# Altium footprint library 集大电协1.5.PcbLib: 227 footprints (part 9 of 18)
Each footprint in its own frame and in the unit in brackets; x right, y up, seen from the top. Pads: shape width x height; smd on the part's side, far side on the other; paste and mask are expansions set on the pad; w line width, h text height; cw(c..) or ccw(c..) is an arc to the next point about the centre after c.
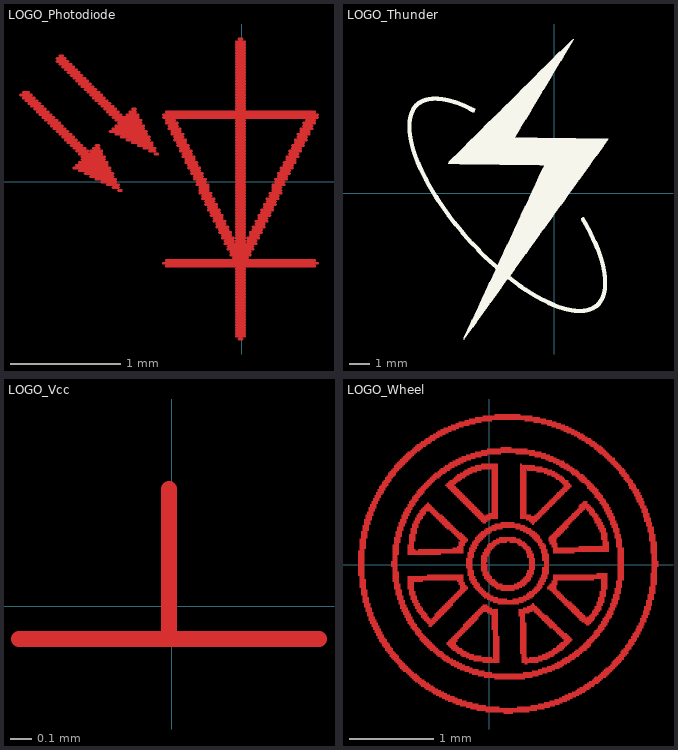
[diagram p8: the footprints below, top view; thin cyan lines are the x and y axes]

## LOGO_Photodiode [mm]
Top Layer:
  lines w0.025: -2.007,0.787 -1.905,0.787 ; -1.981,0.762 -1.88,0.762 ; -1.981,0.813 -1.93,0.813 ; -1.956,0.737 -1.854,0.737 ; -1.93,0.711 -1.829,0.711 ; -1.905,0.686 -1.803,0.686 ; -1.88,0.66 -1.778,0.66 ; -1.854,0.635 -1.753,0.635 ; -1.829,0.61 -1.727,0.61 ; -1.803,0.584 -1.702,0.584 ; -1.778,0.559 -1.676,0.559 ; -1.753,0.533 -1.651,0.533 ; -1.727,0.508 -1.626,0.508 ; -1.702,0.483 -1.6,0.483 ; -1.676,0.457 -1.575,0.457 ; -1.676,1.092 -1.575,1.092 ; -1.676,1.118 -1.6,1.118 ; -1.651,0.432 -1.549,0.432 ; -1.651,1.067 -1.549,1.067 ; -1.651,1.143 -1.626,1.143 ; -1.626,0.406 -1.524,0.406 ; -1.626,1.041 -1.524,1.041 ; -1.6,0.381 -1.499,0.381 ; -1.6,1.016 -1.499,1.016 ; -1.575,0.356 -1.473,0.356 ; -1.575,0.991 -1.473,0.991 ; -1.549,0.33 -1.448,0.33 ; -1.549,0.965 -1.448,0.965 ; -1.524,0.127 -1.194,0.127 ; -1.524,0.305 -1.422,0.305 ; -1.524,0.94 -1.422,0.94 ; -1.499,0.152 -1.219,0.152 ; -1.499,0.279 -1.397,0.279 ; -1.499,0.914 -1.397,0.914 ; -1.473,0.102 -1.194,0.102 ; -1.473,0.178 -1.219,0.178 ; -1.473,0.254 -1.27,0.254 ; -1.473,0.889 -1.372,0.889 ; -1.448,0.203 -1.245,0.203 ; -1.448,0.229 -1.245,0.229 ; -1.448,0.864 -1.346,0.864 ; -1.422,0.076 -1.168,0.076 ; -1.422,0.838 -1.321,0.838 ; -1.397,0.813 -1.295,0.813 ; -1.372,0.051 -1.168,0.051 ; -1.372,0.279 -1.27,0.279 ; -1.372,0.787 -1.27,0.787 ; -1.346,0.305 -1.295,0.305 ; -1.346,0.762 -1.245,0.762 ; -1.321,0.025 -1.143,0.025 ; -1.321,0.33 -1.295,0.33 ; -1.321,0.737 -1.219,0.737 ; -1.295,0.711 -1.194,0.711 ; -1.27,0 -1.143,0 ; -1.27,0.686 -1.168,0.686 ; -1.245,0.66 -1.143,0.66 ; -1.219,-0.025 -1.118,-0.025 ; -1.219,0.635 -1.118,0.635 ; -1.194,0.457 -0.864,0.457 ; -1.194,0.61 -1.092,0.61 ; -1.168,-0.051 -1.118,-0.051 ; -1.168,0.483 -0.889,0.483 ; -1.168,0.584 -0.94,0.584 ; -1.143,0.432 -0.864,0.432 ; -1.143,0.508 -0.889,0.508 ; -1.143,0.559 -0.914,0.559 ; -1.118,-0.076 -1.092,-0.076 ; -1.118,0.533 -0.914,0.533 ; -1.092,0.406 -0.838,0.406 ; -1.041,0.381 -0.838,0.381 ; -1.041,0.61 -0.94,0.61 ; -1.016,0.635 -0.965,0.635 ; -0.991,0.356 -0.813,0.356 ; -0.991,0.66 -0.965,0.66 ; -0.94,0.33 -0.813,0.33 ; -0.889,0.305 -0.787,0.305 ; -0.838,0.279 -0.787,0.279 ; -0.787,0.254 -0.762,0.254 ; -0.711,-0.737 0.686,-0.737 ; -0.711,0.584 0.686,0.584 ; -0.711,0.61 0.686,0.61 ; -0.686,-0.762 0.66,-0.762 ; -0.686,-0.711 0.66,-0.711 ; -0.686,0.533 -0.584,0.533 ; -0.686,0.559 -0.61,0.559 ; -0.686,0.635 0.66,0.635 ; -0.66,0.483 -0.559,0.483 ; -0.66,0.508 -0.584,0.508 ; -0.635,0.432 -0.533,0.432 ; -0.635,0.457 -0.559,0.457 ; -0.61,0.381 -0.508,0.381 ; -0.61,0.406 -0.533,0.406 ; -0.584,0.33 -0.483,0.33 ; -0.584,0.356 -0.508,0.356 ; -0.559,0.279 -0.457,0.279 ; -0.559,0.305 -0.483,0.305 ; -0.533,0.229 -0.432,0.229 ; -0.533,0.254 -0.457,0.254 ; -0.508,0.178 -0.406,0.178 ; -0.508,0.203 -0.432,0.203 ; -0.483,0.127 -0.381,0.127 ; -0.483,0.152 -0.406,0.152 ; -0.457,0.076 -0.356,0.076 ; -0.457,0.102 -0.381,0.102 ; -0.432,0.025 -0.33,0.025 ; -0.432,0.051 -0.356,0.051 ; -0.406,-0.025 -0.305,-0.025 ; -0.406,0 -0.33,0 ; -0.381,-0.102 -0.279,-0.102 ; -0.381,-0.076 -0.305,-0.076 ; -0.381,-0.051 -0.305,-0.051 ; -0.356,-0.152 -0.254,-0.152 ; -0.356,-0.127 -0.279,-0.127 ; -0.33,-0.203 -0.229,-0.203 ; -0.33,-0.178 -0.254,-0.178 ; -0.305,-0.254 -0.203,-0.254 ; -0.305,-0.229 -0.229,-0.229 ; -0.279,-0.305 -0.178,-0.305 ; -0.279,-0.279 -0.203,-0.279 ; -0.254,-0.356 -0.152,-0.356 ; -0.254,-0.33 -0.178,-0.33 ; -0.229,-0.406 -0.127,-0.406 ; -0.229,-0.381 -0.152,-0.381 ; -0.203,-0.457 -0.102,-0.457 ; -0.203,-0.432 -0.127,-0.432 ; -0.178,-0.508 -0.076,-0.508 ; -0.178,-0.483 -0.102,-0.483 ; -0.152,-0.559 0.127,-0.559 ; -0.152,-0.533 -0.076,-0.533 ; -0.127,-0.61 0.102,-0.61 ; -0.127,-0.584 0.102,-0.584 ; -0.102,-0.66 0.076,-0.66 ; -0.102,-0.635 0.076,-0.635 ; -0.076,-0.686 0.051,-0.686 ; -0.051,-1.397 0.025,-1.397 ; -0.051,-1.372 0.025,-1.372 ; -0.051,-1.346 0.025,-1.346 ; -0.051,-1.321 0.025,-1.321 ; -0.051,-1.295 0.025,-1.295 ; -0.051,-1.27 0.025,-1.27 ; -0.051,-1.245 0.025,-1.245 ; -0.051,-1.219 0.025,-1.219 ; -0.051,-1.194 0.025,-1.194 ; -0.051,-1.168 0.025,-1.168 ; -0.051,-1.143 0.025,-1.143 ; -0.051,-1.118 0.025,-1.118 ; -0.051,-1.092 0.025,-1.092 ; -0.051,-1.067 0.025,-1.067 ; -0.051,-1.041 0.025,-1.041 ; -0.051,-1.016 0.025,-1.016 ; -0.051,-0.991 0.025,-0.991 ; -0.051,-0.965 0.025,-0.965 ; -0.051,-0.94 0.025,-0.94 ; -0.051,-0.914 0.025,-0.914 ; -0.051,-0.889 0.025,-0.889 ; -0.051,-0.864 0.025,-0.864 ; -0.051,-0.838 0.025,-0.838 ; -0.051,-0.813 0.025,-0.813 ; -0.051,-0.787 0.025,-0.787 ; -0.051,-0.533 0.025,-0.533 ; -0.051,-0.508 0.025,-0.508 ; -0.051,-0.483 0.025,-0.483 ; -0.051,-0.457 0.025,-0.457 ; -0.051,-0.432 0.025,-0.432 ; -0.051,-0.406 0.025,-0.406 ; -0.051,-0.381 0.025,-0.381 ; -0.051,-0.356 0.025,-0.356 ; -0.051,-0.33 0.025,-0.33 ; -0.051,-0.305 0.025,-0.305 ; -0.051,-0.279 0.025,-0.279 ; -0.051,-0.254 0.025,-0.254 ; -0.051,-0.229 0.025,-0.229 ; -0.051,-0.203 0.025,-0.203 ; -0.051,-0.178 0.025,-0.178 ; -0.051,-0.152 0.025,-0.152 ; -0.051,-0.127 0.025,-0.127 ; -0.051,-0.102 0.025,-0.102 ; -0.051,-0.076 0.025,-0.076 ; -0.051,-0.051 0.025,-0.051 ; -0.051,-0.025 0.025,-0.025 ; -0.051,0 0.025,0 ; -0.051,0.025 0.025,0.025 ; -0.051,0.051 0.025,0.051 ; -0.051,0.076 0.025,0.076 ; -0.051,0.102 0.025,0.102 ; -0.051,0.127 0.025,0.127 ; -0.051,0.152 0.025,0.152 ; -0.051,0.178 0.025,0.178 ; -0.051,0.203 0.025,0.203 ; -0.051,0.229 0.025,0.229 ; -0.051,0.254 0.025,0.254 ; -0.051,0.279 0.025,0.279 ; -0.051,0.305 0.025,0.305 ; -0.051,0.33 0.025,0.33 ; -0.051,0.356 0.025,0.356 ; -0.051,0.381 0.025,0.381 ; -0.051,0.406 0.025,0.406 ; -0.051,0.432 0.025,0.432 ; -0.051,0.457 0.025,0.457 ; -0.051,0.483 0.025,0.483 ; -0.051,0.508 0.025,0.508 ; -0.051,0.533 0.025,0.533 ; -0.051,0.559 0.025,0.559 ; -0.051,0.66 0.025,0.66 ; -0.051,0.686 0.025,0.686 ; -0.051,0.711 0.025,0.711 ; -0.051,0.737 0.025,0.737 ; -0.051,0.762 0.025,0.762 ; -0.051,0.787 0.025,0.787 ; -0.051,0.813 0.025,0.813 ; -0.051,0.838 0.025,0.838 ; -0.051,0.864 0.025,0.864 ; -0.051,0.889 0.025,0.889 ; -0.051,0.914 0.025,0.914 ; -0.051,0.94 0.025,0.94 ; -0.051,0.965 0.025,0.965 ; -0.051,0.991 0.025,0.991 ; -0.051,1.016 0.025,1.016 ; -0.051,1.041 0.025,1.041 ; -0.051,1.067 0.025,1.067 ; -0.051,1.092 0.025,1.092 ; -0.051,1.118 0.025,1.118 ; -0.051,1.143 0.025,1.143 ; -0.051,1.168 0.025,1.168 ; -0.051,1.194 0.025,1.194 ; -0.051,1.219 0.025,1.219 ; -0.051,1.245 0.025,1.245 ; -0.051,1.27 0.025,1.27 ; -0.025,-1.422 0,-1.422 ; -0.025,1.295 0,1.295 ; 0.051,-0.533 0.127,-0.533 ; 0.051,-0.508 0.152,-0.508 ; 0.076,-0.483 0.152,-0.483 ; 0.076,-0.457 0.178,-0.457 ; 0.102,-0.432 0.178,-0.432 ; 0.102,-0.406 0.203,-0.406 ; 0.127,-0.381 0.203,-0.381 ; 0.127,-0.356 0.229,-0.356 ; 0.152,-0.33 0.229,-0.33 ; 0.152,-0.305 0.254,-0.305 ; 0.178,-0.279 0.254,-0.279 ; 0.178,-0.254 0.279,-0.254 ; 0.203,-0.229 0.279,-0.229 ; 0.203,-0.203 0.305,-0.203 ; 0.229,-0.178 0.305,-0.178 ; 0.229,-0.152 0.33,-0.152 ; 0.254,-0.127 0.33,-0.127 ; 0.254,-0.102 0.356,-0.102 ; 0.279,-0.076 0.356,-0.076 ; 0.279,-0.051 0.356,-0.051 ; 0.279,-0.025 0.381,-0.025 ; 0.305,0 0.381,0 ; 0.305,0.025 0.406,0.025 ; 0.33,0.051 0.406,0.051 ; 0.33,0.076 0.432,0.076 ; 0.356,0.102 0.432,0.102 ; 0.356,0.127 0.457,0.127 ; 0.381,0.152 0.457,0.152 ; 0.381,0.178 0.483,0.178 ; 0.406,0.203 0.483,0.203 ; 0.406,0.229 0.508,0.229 ; 0.432,0.254 0.508,0.254 ; 0.432,0.279 0.533,0.279 ; 0.457,0.305 0.533,0.305 ; 0.457,0.33 0.559,0.33 ; 0.483,0.356 0.559,0.356 ; 0.483,0.381 0.584,0.381 ; 0.508,0.406 0.584,0.406 ; 0.508,0.432 0.61,0.432 ; 0.533,0.457 0.61,0.457 ; 0.533,0.483 0.635,0.483 ; 0.559,0.508 0.635,0.508 ; 0.559,0.533 0.66,0.533 ; 0.584,0.559 0.66,0.559

## LOGO_Thunder [mm]
Top Overlay:
  drawing of 2284 lines, arcs and shapes, not listed

## LOGO_Vcc [mm]
Top Layer:
  lines w0.076: -0.711,-0.152 0.686,-0.152 ; -0.013,-0.152 -0.013,0.546
  text "5V" at -0.584,-0.914 h1.02

## LOGO_Wheel [mm]
Top Layer:
  lines w0.018: -1.554,-0.124 -1.483,-0.124 ; -1.554,-0.107 -1.483,-0.107 ; -1.554,-0.089 -1.483,-0.089 ; -1.554,-0.071 -1.483,-0.071 ; -1.554,-0.053 -1.483,-0.053 ; -1.554,-0.036 -1.483,-0.036 ; -1.554,-0.018 -1.483,-0.018 ; -1.554,0 -1.483,0 ; -1.554,0.018 -1.483,0.018 ; -1.554,0.036 -1.483,0.036 ; -1.554,0.053 -1.483,0.053 ; -1.554,0.071 -1.483,0.071 ; -1.554,0.089 -1.483,0.089 ; -1.554,0.107 -1.483,0.107 ; -1.554,0.124 -1.483,0.124 ; -1.554,0.142 -1.483,0.142 ; -1.554,0.16 -1.483,0.16 ; -1.537,-0.267 -1.466,-0.267 ; -1.537,-0.249 -1.466,-0.249 ; -1.537,-0.231 -1.466,-0.231 ; -1.537,-0.213 -1.466,-0.213 ; -1.537,-0.196 -1.466,-0.196 ; -1.537,-0.178 -1.466,-0.178 ; -1.537,-0.16 -1.483,-0.16 ; -1.537,-0.142 -1.483,-0.142 ; -1.537,0.178 -1.483,0.178 ; -1.537,0.196 -1.466,0.196 ; -1.537,0.213 -1.466,0.213 ; -1.537,0.231 -1.466,0.231 ; -1.537,0.249 -1.466,0.249 ; -1.537,0.267 -1.466,0.267 ; -1.537,0.284 -1.466,0.284 ; -1.537,0.302 -1.466,0.302 ; -1.519,-0.356 -1.448,-0.356 ; -1.519,-0.338 -1.448,-0.338 ; -1.519,-0.32 -1.448,-0.32 ; -1.519,-0.302 -1.448,-0.302 ; -1.519,-0.284 -1.466,-0.284 ; -1.519,0.32 -1.448,0.32 ; -1.519,0.338 -1.448,0.338 ; -1.519,0.356 -1.448,0.356 ; -1.519,0.373 -1.448,0.373 ; -1.519,0.391 -1.448,0.391 ; -1.501,-0.445 -1.43,-0.445 ; -1.501,-0.427 -1.43,-0.427 ; -1.501,-0.409 -1.43,-0.409 ; -1.501,-0.391 -1.43,-0.391 ; -1.501,-0.373 -1.448,-0.373 ; -1.501,0.409 -1.43,0.409 ; -1.501,0.427 -1.43,0.427 ; -1.501,0.445 -1.43,0.445 ; -1.501,0.462 -1.43,0.462 ; -1.483,-0.498 -1.412,-0.498 ; -1.483,-0.48 -1.412,-0.48 ; -1.483,-0.462 -1.412,-0.462 ; -1.483,0.48 -1.412,0.48 ; -1.483,0.498 -1.412,0.498 ; -1.483,0.516 -1.412,0.516 ; -1.483,0.533 -1.394,0.533 ; -1.466,-0.551 -1.394,-0.551 ; -1.466,-0.533 -1.394,-0.533 ; -1.466,-0.516 -1.394,-0.516 ; -1.466,0.551 -1.394,0.551 ; -1.466,0.569 -1.394,0.569 ; -1.466,0.587 -1.377,0.587 ; -1.448,-0.605 -1.377,-0.605 ; -1.448,-0.587 -1.377,-0.587 ; -1.448,-0.569 -1.377,-0.569 ; -1.448,0.605 -1.377,0.605 ; -1.448,0.622 -1.377,0.622 ; -1.43,-0.658 -1.341,-0.658 ; -1.43,-0.64 -1.359,-0.64 ; -1.43,-0.622 -1.359,-0.622 ; -1.43,0.64 -1.359,0.64 ; -1.43,0.658 -1.359,0.658 ; -1.43,0.676 -1.341,0.676 ; -1.412,-0.693 -1.323,-0.693 ; -1.412,-0.676 -1.341,-0.676 ; -1.412,0.693 -1.341,0.693 ; -1.412,0.711 -1.341,0.711 ; -1.394,-0.729 -1.306,-0.729 ; -1.394,-0.711 -1.323,-0.711 ; -1.394,0.729 -1.323,0.729 ; -1.394,0.747 -1.323,0.747 ; -1.377,-0.765 -1.288,-0.765 ; -1.377,-0.747 -1.306,-0.747 ; -1.377,0.765 -1.306,0.765 ; -1.377,0.782 -1.306,0.782 ; -1.359,-0.8 -1.27,-0.8 ; -1.359,-0.782 -1.288,-0.782 ; -1.359,0.8 -1.288,0.8 ; -1.359,0.818 -1.288,0.818 ; -1.341,-0.836 -1.252,-0.836 ; -1.341,-0.818 -1.27,-0.818 ; -1.341,0.836 -1.27,0.836 ; -1.341,0.853 -1.252,0.853 ; -1.323,-0.871 -1.234,-0.871 ; -1.323,-0.853 -1.252,-0.853 ; -1.323,0.871 -1.252,0.871 ; -1.323,0.889 -1.234,0.889 ; -1.306,-0.907 -1.217,-0.907 ; -1.306,-0.889 -1.217,-0.889 ; -1.306,0.907 -1.234,0.907 ; -1.306,0.925 -1.217,0.925 ; -1.288,-0.925 -1.199,-0.925 ; -1.288,0.942 -1.199,0.942 ; -1.27,-0.96 -1.181,-0.96 ; -1.27,-0.942 -1.181,-0.942 ; -1.27,0.96 -1.199,0.96 ; -1.27,0.978 -1.181,0.978 ; -1.252,-0.978 -1.163,-0.978 ; -1.252,0.996 -1.163,0.996 ; -1.234,-1.013 -1.146,-1.013 ; -1.234,-0.996 -1.146,-0.996 ; -1.234,1.013 -1.163,1.013 ; -1.234,1.031 -1.146,1.031 ; -1.217,-1.031 -1.128,-1.031 ; -1.217,1.049 -1.128,1.049 ; -1.199,-1.049 -1.11,-1.049 ; -1.199,1.067 -1.11,1.067 ; -1.199,1.085 -1.11,1.085 ; -1.181,-1.085 -1.074,-1.085 ; -1.181,-1.067 -1.092,-1.067 ; -1.181,1.102 -1.092,1.102 ; -1.163,-1.102 -1.074,-1.102 ; -1.163,-0.018 -1.092,-0.018 ; -1.163,0 -1.092,0 ; -1.163,0.018 -1.092,0.018 ; -1.163,0.036 -1.092,0.036 ; -1.163,1.12 -1.074,1.12 ; -1.146,-1.12 -1.057,-1.12 ; -1.146,-0.196 -1.074,-0.196 ; -1.146,-0.178 -1.074,-0.178 ; -1.146,-0.16 -1.074,-0.16 ; -1.146,-0.142 -1.074,-0.142 ; -1.146,-0.124 -1.074,-0.124 ; -1.146,-0.107 -1.074,-0.107 ; -1.146,-0.089 -1.074,-0.089 ; -1.146,-0.071 -1.092,-0.071 ; -1.146,-0.053 -1.092,-0.053 ; -1.146,-0.036 -1.092,-0.036 ; -1.146,0.053 -1.092,0.053 ; -1.146,0.071 -1.092,0.071 ; -1.146,0.089 -1.092,0.089 ; -1.146,0.107 -1.092,0.107 ; -1.146,0.124 -1.074,0.124 ; -1.146,0.142 -1.074,0.142 ; -1.146,0.16 -1.074,0.16 ; -1.146,0.178 -1.074,0.178 ; -1.146,0.196 -1.074,0.196 ; -1.146,0.213 -1.074,0.213 ; -1.146,0.231 -1.074,0.231 ; -1.146,1.138 -1.057,1.138 ; -1.128,-1.138 -1.039,-1.138 ; -1.128,-0.284 -1.057,-0.284 ; -1.128,-0.267 -1.057,-0.267 ; -1.128,-0.249 -1.057,-0.249 ; -1.128,-0.231 -1.057,-0.231 ; -1.128,-0.213 -1.074,-0.213 ; -1.128,0.249 -1.074,0.249 ; -1.128,0.267 -1.057,0.267 ; -1.128,0.284 -1.057,0.284 ; -1.128,0.302 -1.057,0.302 ; -1.128,0.32 -1.057,0.32 ; -1.128,1.156 -1.039,1.156 ; -1.128,1.173 -1.021,1.173 ; -1.11,-1.156 -1.021,-1.156 ; -1.11,-0.356 -1.039,-0.356 ; -1.11,-0.338 -1.039,-0.338 ; -1.11,-0.32 -1.039,-0.32 ; -1.11,-0.302 -1.039,-0.302 ; -1.11,0.338 -1.039,0.338 ; -1.11,0.356 -1.039,0.356 ; -1.11,0.373 -1.039,0.373 ; -1.11,0.391 -1.039,0.391 ; -1.11,1.191 -1.003,1.191 ; -1.092,-1.173 -1.003,-1.173 ; -1.092,-0.409 -1.021,-0.409 ; -1.092,-0.391 -1.021,-0.391 ; -1.092,-0.373 -1.021,-0.373 ; -1.092,0.409 -1.021,0.409 ; -1.092,0.427 -1.021,0.427 ; -1.092,0.445 -1.021,0.445 ; -1.092,1.209 -0.986,1.209 ; -1.074,-1.209 -0.968,-1.209 ; -1.074,-1.191 -0.986,-1.191 ; -1.074,-0.462 -1.003,-0.462 ; -1.074,-0.445 -1.003,-0.445 ; -1.074,-0.427 -1.003,-0.427 ; -1.074,0.462 -1.003,0.462 ; -1.074,0.48 -1.003,0.48 ; -1.074,0.498 -0.986,0.498 ; -1.074,1.227 -0.968,1.227 ; -1.057,-1.227 -0.95,-1.227 ; -1.057,-0.516 -0.968,-0.516 ; -1.057,-0.498 -0.986,-0.498 ; -1.057,-0.48 -0.986,-0.48 ; -1.057,0.516 -0.986,0.516 ; -1.057,0.533 -0.986,0.533 ; -1.057,1.245 -0.95,1.245 ; -1.039,-1.245 -0.932,-1.245 ; -1.039,-0.551 -0.95,-0.551 ; -1.039,-0.533 -0.968,-0.533 ; -1.039,0.551 -0.968,0.551 ; -1.039,0.569 -0.968,0.569 ; -1.039,0.587 -0.95,0.587 ; -1.039,1.262 -0.932,1.262 ; -1.021,-1.262 -0.914,-1.262 ; -1.021,-0.587 -0.932,-0.587 ; -1.021,-0.569 -0.95,-0.569 ; -1.021,0.605 -0.95,0.605 ; -1.021,0.622 -0.932,0.622 ; -1.021,1.28 -0.914,1.28 ; -1.003,-0.622 -0.914,-0.622 ; -1.003,-0.605 -0.932,-0.605 ; -1.003,0.64 -0.932,0.64 ; -1.003,0.658 -0.914,0.658 ; -1.003,1.298 -0.897,1.298 ; -0.986,-1.28 -0.897,-1.28 ; -0.986,-0.658 -0.897,-0.658 ; -0.986,-0.64 -0.914,-0.64 ; -0.986,0.676 -0.914,0.676 ; -0.986,1.316 -0.879,1.316 ; -0.968,-1.298 -0.861,-1.298 ; -0.968,-0.693 -0.879,-0.693 ; -0.968,-0.676 -0.897,-0.676 ; -0.968,-0.284 -0.897,-0.284 ; -0.968,-0.267 -0.897,-0.267 ; -0.968,-0.249 -0.897,-0.249 ; -0.968,-0.231 -0.897,-0.231 ; -0.968,-0.213 -0.897,-0.213 ; -0.968,-0.196 -0.79,-0.196 ; -0.968,-0.178 -0.31,-0.178 ; -0.968,-0.16 -0.31,-0.16 ; -0.968,-0.142 -0.31,-0.142 ; -0.968,0.124 -0.577,0.124 ; -0.968,0.142 -0.31,0.142 ; -0.968,0.16 -0.31,0.16 ; -0.968,0.178 -0.879,0.178 ; -0.968,0.196 -0.897,0.196 ; -0.968,0.213 -0.897,0.213 ; -0.968,0.231 -0.897,0.231 ; -0.968,0.693 -0.897,0.693 ; -0.968,0.711 -0.879,0.711 ; -0.968,1.333 -0.861,1.333 ; -0.95,-1.316 -0.843,-1.316 ; -0.95,-0.711 -0.861,-0.711 ; -0.95,-0.356 -0.879,-0.356 ; -0.95,-0.338 -0.879,-0.338 ; -0.95,-0.32 -0.879,-0.32 ; -0.95,-0.302 -0.897,-0.302 ; -0.95,0.249 -0.897,0.249 ; -0.95,0.267 -0.897,0.267 ; -0.95,0.284 -0.879,0.284 ; -0.95,0.302 -0.879,0.302 ; -0.95,0.32 -0.879,0.32 ; -0.95,0.338 -0.879,0.338 ; -0.95,0.356 -0.879,0.356 ; -0.95,0.729 -0.879,0.729 ; -0.95,0.747 -0.861,0.747 ; -0.932,-1.333 -0.826,-1.333 ; -0.932,-0.747 -0.843,-0.747 ; -0.932,-0.729 -0.861,-0.729 ; -0.932,-0.409 -0.861,-0.409 ; -0.932,-0.391 -0.861,-0.391 ; -0.932,-0.373 -0.861,-0.373 ; -0.932,0.373 -0.861,0.373 ; -0.932,0.391 -0.861,0.391 ; -0.932,0.409 -0.861,0.409 ; -0.932,0.427 -0.861,0.427 ; -0.932,0.765 -0.843,0.765 ; -0.932,1.351 -0.826,1.351 ; -0.914,-1.351 -0.808,-1.351 ; -0.914,-0.765 -0.826,-0.765 ; -0.914,-0.445 -0.843,-0.445 ; -0.914,-0.427 -0.843,-0.427 ; -0.914,0.445 -0.843,0.445 ; -0.914,0.462 -0.843,0.462 ; -0.914,0.48 -0.843,0.48 ; -0.914,0.782 -0.843,0.782 ; -0.914,0.8 -0.826,0.8 ; -0.914,1.369 -0.808,1.369 ; -0.897,-1.369 -0.772,-1.369 ; -0.897,-0.782 -0.808,-0.782 ; -0.897,-0.48 -0.826,-0.48 ; -0.897,-0.462 -0.826,-0.462 ; -0.897,0.498 -0.826,0.498 ; -0.897,0.516 -0.826,0.516 ; -0.897,0.818 -0.808,0.818 ; -0.897,1.387 -0.79,1.387 ; -0.879,-1.387 -0.754,-1.387 ; -0.879,-0.818 -0.79,-0.818 ; -0.879,-0.8 -0.808,-0.8 ; -0.879,-0.516 -0.79,-0.516 ; -0.879,-0.498 -0.808,-0.498 ; -0.879,0.533 -0.808,0.533 ; -0.879,0.551 -0.79,0.551 ; -0.879,0.836 -0.79,0.836 ; -0.879,1.405 -0.754,1.405 ; -0.861,-0.836 -0.772,-0.836 ; -0.861,-0.551 -0.772,-0.551 ; -0.861,-0.533 -0.79,-0.533 ; -0.861,0.569 -0.79,0.569 ; -0.861,0.587 -0.772,0.587 ; -0.861,0.853 -0.772,0.853 ; -0.861,0.871 -0.772,0.871 ; -0.861,1.422 -0.737,1.422 ; -0.843,-1.405 -0.719,-1.405 ; -0.843,-0.853 -0.754,-0.853 ; -0.843,-0.569 -0.754,-0.569 ; -0.843,0.178 -0.31,0.178 ; -0.843,0.605 -0.754,0.605 ; -0.843,0.889 -0.754,0.889 ; -0.826,-1.422 -0.701,-1.422 ; -0.826,-0.889 -0.719,-0.889 ; -0.826,-0.871 -0.737,-0.871 ; -0.826,-0.587 -0.737,-0.587 ; -0.826,0.622 -0.754,0.622 ; -0.826,0.64 -0.63,0.64 ; -0.826,0.907 -0.737,0.907 ; -0.826,1.44 -0.701,1.44 ; -0.808,-1.44 -0.665,-1.44 ; -0.808,-0.907 -0.701,-0.907 ; -0.808,-0.622 -0.719,-0.622 ; -0.808,-0.605 -0.737,-0.605 ; -0.808,0.658 -0.648,0.658 ; -0.808,0.925 -0.719,0.925 ; -0.808,1.458 -0.683,1.458 ; -0.79,-0.925 -0.683,-0.925 ; -0.79,-0.64 -0.701,-0.64 ; -0.79,0.676 -0.665,0.676 ; -0.79,0.942 -0.701,0.942 ; -0.772,-1.458 -0.648,-1.458 ; -0.772,-0.942 -0.665,-0.942 ; -0.772,-0.658 -0.612,-0.658 ; -0.772,0.693 -0.683,0.693 ; -0.772,0.96 -0.683,0.96 ; -0.772,1.476 -0.648,1.476 ; -0.754,-1.476 -0.612,-1.476 ; -0.754,-0.96 -0.648,-0.96 ; -0.754,-0.676 -0.63,-0.676 ; -0.754,0.711 -0.701,0.711 ; -0.754,0.978 -0.665,0.978 ; -0.754,1.494 -0.63,1.494 ; -0.737,-0.978 -0.63,-0.978 ; -0.737,-0.693 -0.648,-0.693 ; -0.737,-0.124 -0.31,-0.124 ; -0.737,0.729 -0.719,0.729 ; -0.737,0.996 -0.648,0.996 ; -0.719,-1.494 -0.577,-1.494 ; -0.719,-0.996 -0.612,-0.996 ; -0.719,-0.729 -0.683,-0.729 ; -0.719,-0.711 -0.665,-0.711 ; -0.719,1.013 -0.63,1.013 ; -0.719,1.511 -0.594,1.511 ; -0.701,-1.013 -0.594,-1.013 ; -0.701,0.622 -0.612,0.622 ; -0.701,1.031 -0.594,1.031 ; -0.701,1.529 -0.559,1.529 ; -0.683,-1.511 -0.541,-1.511 ; -0.683,-0.64 -0.594,-0.64 ; -0.683,0.605 -0.594,0.605 ; -0.683,1.049 -0.577,1.049 ; -0.665,-1.529 -0.505,-1.529 ; -0.665,-1.031 -0.559,-1.031 ; -0.665,-0.622 -0.577,-0.622 ; -0.665,0.587 -0.559,0.587 ; -0.665,1.067 -0.559,1.067 ; -0.665,1.547 -0.523,1.547 ; -0.648,-1.049 -0.541,-1.049 ; -0.648,-0.605 -0.559,-0.605 ; -0.648,-0.587 -0.541,-0.587 ; -0.648,0.569 -0.541,0.569 ; -0.648,1.085 -0.523,1.085 ; -0.63,-1.547 -0.47,-1.547 ; -0.63,-1.067 -0.523,-1.067 ; -0.63,-0.569 -0.523,-0.569 ; -0.63,0.551 -0.523,0.551 ; -0.63,1.565 -0.488,1.565 ; -0.612,-1.085 -0.488,-1.085 ; -0.612,-0.551 -0.505,-0.551 ; -0.612,0.533 -0.505,0.533 ; -0.612,1.102 -0.505,1.102 ; -0.612,1.582 -0.452,1.582 ; -0.594,-1.565 -0.417,-1.565 ; -0.594,-0.533 -0.488,-0.533 ; -0.594,0.516 -0.488,0.516 ; -0.594,1.12 -0.47,1.12 ; -0.577,-1.102 -0.47,-1.102 ; -0.577,-0.516 -0.47,-0.516 ; -0.577,0.498 -0.47,0.498 ; -0.577,1.138 -0.452,1.138 ; -0.577,1.6 -0.399,1.6 ; -0.559,-1.582 -0.381,-1.582 ; -0.559,-1.12 -0.434,-1.12 ; -0.559,-0.498 -0.452,-0.498 ; -0.559,0.48 -0.452,0.48 ; -0.541,-1.138 -0.399,-1.138 ; -0.541,-0.48 -0.434,-0.48 ; -0.541,0.462 -0.434,0.462 ; -0.541,1.156 -0.417,1.156 ; -0.541,1.618 -0.363,1.618 ; -0.523,-1.6 -0.328,-1.6 ; -0.523,-0.462 -0.434,-0.462 ; -0.523,0.445 -0.417,0.445 ; -0.523,0.942 -0.417,0.942 ; -0.523,1.173 -0.381,1.173 ; -0.505,-1.156 -0.363,-1.156 ; -0.505,-0.942 -0.399,-0.942 ; -0.505,-0.925 -0.399,-0.925 ; -0.505,-0.445 -0.417,-0.445 ; -0.505,0.427 -0.399,0.427 ; -0.505,0.925 -0.399,0.925 ; -0.505,0.96 -0.399,0.96 ; -0.488,-1.618 -0.274,-1.618 ; -0.488,-0.96 -0.381,-0.96 ; -0.488,-0.907 -0.381,-0.907 ; -0.488,-0.427 -0.399,-0.427 ; -0.488,0.907 -0.381,0.907 ; -0.488,0.978 -0.381,0.978 ; -0.488,1.191 -0.345,1.191 ; -0.488,1.636 -0.31,1.636 ; -0.47,-1.173 -0.328,-1.173 ; -0.47,-0.978 -0.363,-0.978 ; -0.47,-0.889 -0.381,-0.889 ; -0.47,-0.409 -0.381,-0.409 ; -0.47,0.409 -0.381,0.409 ; -0.47,0.889 -0.363,0.889 ; -0.47,0.996 -0.345,0.996 ; -0.47,1.209 -0.31,1.209 ; -0.452,-1.191 -0.292,-1.191 ; -0.452,-0.996 -0.328,-0.996 ; -0.452,-0.871 -0.363,-0.871 ; -0.452,-0.391 -0.363,-0.391 ; -0.452,0.391 -0.363,0.391 ; -0.452,0.871 -0.345,0.871 ; -0.452,1.654 -0.239,1.654 ; -0.434,-1.636 -0.203,-1.636 ; -0.434,-1.013 -0.31,-1.013 ; -0.434,-0.853 -0.345,-0.853 ; -0.434,-0.373 -0.345,-0.373 ; -0.434,0.196 -0.31,0.196 ; -0.434,0.373 -0.328,0.373 ; -0.434,0.853 -0.328,0.853 ; -0.434,1.013 -0.328,1.013 ; -0.434,1.227 -0.274,1.227 ; -0.417,-1.209 -0.239,-1.209 ; -0.417,-0.836 -0.328,-0.836 ; -0.417,-0.356 -0.328,-0.356 ; -0.417,0.356 -0.31,0.356 ; -0.417,0.836 -0.31,0.836 ; -0.417,1.031 -0.292,1.031 ; -0.399,-1.654 -0.132,-1.654 ; -0.399,-1.031 -0.274,-1.031 ; -0.399,-0.818 -0.31,-0.818 ; -0.399,-0.338 -0.31,-0.338 ; -0.399,0.338 -0.292,0.338 ; -0.399,0.818 -0.292,0.818 ; -0.399,1.049 -0.274,1.049 ; -0.399,1.245 -0.221,1.245 ; -0.399,1.671 -0.168,1.671 ; -0.381,-1.227 -0.203,-1.227 ; -0.381,-1.049 -0.239,-1.049 ; -0.381,-0.8 -0.292,-0.8 ; -0.381,-0.32 -0.292,-0.32 ; -0.381,-0.196 -0.31,-0.196 ; -0.381,0.213 -0.31,0.213 ; -0.381,0.32 -0.274,0.32 ; -0.381,0.8 -0.274,0.8 ; -0.381,1.067 -0.239,1.067 ; -0.363,-0.782 -0.274,-0.782 ; -0.363,-0.302 -0.274,-0.302 ; -0.363,-0.231 -0.292,-0.231 ; -0.363,-0.213 -0.292,-0.213 ; -0.363,0.231 -0.292,0.231 ; -0.363,0.249 -0.292,0.249 ; -0.363,0.267 -0.274,0.267 ; -0.363,0.302 -0.257,0.302 ; -0.363,0.782 -0.257,0.782 ; -0.363,1.262 -0.168,1.262 ; -0.363,1.689 -0.097,1.689 ; -0.345,-1.671 -0.043,-1.671 ; -0.345,-1.245 -0.132,-1.245 ; -0.345,-1.067 -0.185,-1.067 ; -0.345,-0.765 -0.257,-0.765 ; -0.345,-0.284 -0.257,-0.284 ; -0.345,-0.267 -0.257,-0.267 ; -0.345,-0.249 -0.274,-0.249 ; -0.345,0.284 -0.257,0.284 ; -0.345,0.765 -0.239,0.765 ; -0.345,1.085 -0.203,1.085 ; -0.328,-1.085 -0.097,-1.085 ; -0.328,-0.747 -0.239,-0.747 ; -0.328,0.747 -0.221,0.747 ; -0.328,1.28 -0.097,1.28 ; -0.31,-0.729 -0.221,-0.729 ; -0.31,-0.711 -0.203,-0.711 ; -0.31,0.729 -0.203,0.729 ; -0.31,1.102 -0.15,1.102 ; -0.292,-1.262 -0.061,-1.262 ; -0.292,-0.693 -0.185,-0.693 ; -0.292,0.711 -0.185,0.711 ; -0.292,1.12 -0.097,1.12 ; -0.292,1.707 0.028,1.707 ; -0.274,-1.689 0.117,-1.689 ; -0.274,-1.102 0.028,-1.102 ; -0.274,-0.676 -0.168,-0.676 ; -0.274,-0.036 -0.203,-0.036 ; -0.274,-0.018 -0.203,-0.018 ; -0.274,0 -0.203,0 ; -0.274,0.018 -0.203,0.018 ; -0.274,0.036 -0.203,0.036 ; -0.274,0.053 -0.203,0.053 ; -0.274,0.071 -0.203,0.071 ; -0.274,0.693 -0.168,0.693 ; -0.274,1.298 -0.025,1.298 ; -0.257,-0.658 -0.15,-0.658 ; -0.257,-0.124 -0.185,-0.124 ; -0.257,-0.107 -0.185,-0.107 ; -0.257,-0.089 -0.185,-0.089 ; -0.257,-0.071 -0.185,-0.071 ; -0.257,-0.053 -0.203,-0.053 ; -0.257,0.089 -0.185,0.089 ; -0.257,0.107 -0.185,0.107 ; -0.257,0.124 -0.185,0.124 ; -0.257,0.142 -0.185,0.142 ; -0.257,0.676 -0.15,0.676 ; -0.257,1.138 0.099,1.138 ; -0.239,-1.28 0.028,-1.28 ; -0.239,-1.12 0.117,-1.12 ; -0.239,-0.64 -0.132,-0.64 ; -0.239,-0.178 -0.15,-0.178 ; -0.239,-0.16 -0.168,-0.16 ; -0.239,-0.142 -0.168,-0.142 ; -0.239,0.16 -0.168,0.16 ; -0.239,0.178 -0.168,0.178 ; -0.239,0.196 -0.15,0.196 ; -0.239,0.658 -0.132,0.658 ; -0.239,1.725 0.668,1.725 ; -0.221,-1.707 0.65,-1.707 ; -0.221,-0.622 -0.132,-0.622 ; -0.221,-0.213 -0.132,-0.213 ; -0.221,-0.196 -0.15,-0.196 ; -0.221,0.213 -0.15,0.213 ; -0.221,0.231 -0.132,0.231 ; -0.221,0.64 -0.114,0.64 ; -0.221,1.156 0.099,1.156 ; -0.221,1.316 0.135,1.316 ; -0.203,-1.298 0.632,-1.298 ; -0.203,-0.605 -0.114,-0.605 ; -0.203,-0.231 -0.114,-0.231 ; -0.203,0.249 -0.132,0.249 ; -0.203,0.267 -0.114,0.267 ; -0.203,0.622 -0.097,0.622 ; -0.185,-1.138 0.117,-1.138 ; -0.185,-0.587 -0.097,-0.587 ; -0.185,-0.267 -0.097,-0.267 ; -0.185,-0.249 -0.114,-0.249 ; -0.185,0.284 -0.097,0.284 ; -0.185,0.605 -0.079,0.605 ; -0.168,-0.569 -0.079,-0.569 ; -0.168,-0.284 -0.079,-0.284 ; -0.168,0.302 -0.079,0.302 ; -0.168,0.32 -0.061,0.32 ; -0.168,0.587 -0.061,0.587 ; -0.168,1.173 0.099,1.173 ; -0.168,1.333 0.615,1.333 ; -0.168,1.742 0.597,1.742 ; -0.15,-1.725 0.561,-1.725 ; -0.15,-0.551 0.099,-0.551 ; -0.15,-0.302 -0.061,-0.302 ; -0.15,0.338 -0.043,0.338 ; -0.15,0.569 0.099,0.569 ; -0.132,-1.316 0.579,-1.316 ; -0.132,-0.533 0.099,-0.533 ; -0.132,-0.32 -0.043,-0.32 ; -0.132,0.356 -0.025,0.356 ; -0.132,0.551 0.099,0.551 ; -0.114,-0.516 0.028,-0.516 ; -0.114,-0.338 -0.008,-0.338 ; -0.114,0.373 0.01,0.373 ; -0.114,0.533 0.01,0.533 ; -0.097,-0.498 -0.008,-0.498 ; -0.097,-0.356 0.01,-0.356 ; -0.097,-0.071 -0.025,-0.071 ; -0.097,-0.053 -0.025,-0.053 ; -0.097,-0.036 -0.025,-0.036 ; -0.097,-0.018 -0.025,-0.018 ; -0.097,0 -0.025,0 ; -0.097,0.018 -0.043,0.018 ; -0.097,0.036 -0.025,0.036 ; -0.097,0.053 -0.025,0.053 ; -0.097,0.071 -0.025,0.071 ; -0.097,0.089 -0.025,0.089 ; -0.097,0.107 -0.008,0.107 ; -0.097,0.391 0.028,0.391 ; -0.097,0.516 -0.025,0.516 ; -0.097,1.191 0.099,1.191 ; -0.097,1.351 0.544,1.351 ; -0.079,-1.156 0.117,-1.156 ; -0.079,-0.48 -0.025,-0.48 ; -0.079,-0.373 0.046,-0.373 ; -0.079,-0.124 0.01,-0.124 ; -0.079,-0.107 -0.008,-0.107 ; -0.079,-0.089 -0.008,-0.089 ; -0.079,0.124 -0.008,0.124 ; -0.079,0.142 0.01,0.142 ; -0.079,0.498 -0.043,0.498 ; -0.079,1.76 0.508,1.76 ; -0.061,-1.333 0.508,-1.333 ; -0.061,-0.391 0.099,-0.391 ; -0.061,-0.16 0.028,-0.16 ; -0.061,-0.142 0.028,-0.142 ; -0.061,0.16 0.01,0.16 ; -0.061,0.178 0.028,0.178 ; -0.061,0.409 0.081,0.409 ; -0.043,-1.742 0.472,-1.742 ; -0.043,-0.178 0.064,-0.178 ; -0.043,0.196 0.046,0.196 ; -0.043,0.427 0.152,0.427 ; -0.043,0.587 0.099,0.587 ; -0.025,-0.569 0.099,-0.569 ; -0.025,-0.409 0.206,-0.409 ; -0.025,-0.196 0.081,-0.196 ; -0.025,0.213 0.064,0.213 ; -0.025,0.231 0.081,0.231 ; -0.025,1.369 0.455,1.369 ; -0.008,-0.213 0.099,-0.213 ; -0.008,0.249 0.117,0.249 ; -0.008,0.445 0.455,0.445 ; -0.008,0.605 0.099,0.605 ; 0.01,-0.587 0.099,-0.587 ; 0.01,-0.427 0.437,-0.427 ; 0.01,-0.231 0.152,-0.231 ; 0.028,-0.765 0.099,-0.765 ; 0.028,-0.747 0.099,-0.747 ; 0.028,-0.729 0.099,-0.729 ; 0.028,-0.711 0.099,-0.711 ; 0.028,-0.693 0.099,-0.693 ; 0.028,-0.676 0.099,-0.676 ; 0.028,-0.658 0.099,-0.658 ; 0.028,-0.64 0.099,-0.64 ; 0.028,-0.622 0.099,-0.622 ; 0.028,-0.605 0.099,-0.605 ; 0.028,-0.249 0.419,-0.249 ; 0.028,0.267 0.206,0.267 ; 0.028,0.462 0.419,0.462 ; 0.028,0.622 0.099,0.622 ; 0.028,0.64 0.099,0.64 ; 0.028,0.658 0.099,0.658 ; 0.028,0.676 0.099,0.676 ; 0.028,0.693 0.099,0.693 ; 0.028,0.711 0.099,0.711 ; 0.028,0.729 0.099,0.729 ; 0.028,0.747 0.099,0.747 ; 0.028,0.765 0.099,0.765 ; 0.028,0.782 0.099,0.782 ; 0.028,0.8 0.099,0.8 ; 0.028,0.818 0.099,0.818 ; 0.028,0.836 0.099,0.836 ; 0.028,0.853 0.099,0.853 ; 0.028,0.871 0.099,0.871 ; 0.028,0.889 0.099,0.889 ; 0.028,0.907 0.099,0.907 ; 0.028,0.925 0.099,0.925 ; 0.028,0.942 0.099,0.942 ; 0.028,0.96 0.099,0.96 ; 0.028,0.978 0.099,0.978 ; 0.028,0.996 0.099,0.996 ; 0.028,1.013 0.099,1.013 ; 0.028,1.031 0.099,1.031 ; 0.028,1.049 0.099,1.049 ; 0.028,1.067 0.099,1.067 ; 0.028,1.085 0.099,1.085 ; 0.028,1.102 0.099,1.102 ; 0.028,1.12 0.099,1.12 ; 0.046,-1.102 0.117,-1.102 ; 0.046,-1.085 0.117,-1.085 ; 0.046,-1.067 0.117,-1.067 ; 0.046,-1.049 0.117,-1.049 ; 0.046,-1.031 0.117,-1.031 ; 0.046,-1.013 0.117,-1.013 ; 0.046,-0.996 0.117,-0.996 ; 0.046,-0.978 0.117,-0.978 ; 0.046,-0.96 0.117,-0.96 ; 0.046,-0.942 0.117,-0.942 ; 0.046,-0.925 0.117,-0.925 ; 0.046,-0.907 0.117,-0.907 ; 0.046,-0.889 0.117,-0.889 ; 0.046,-0.871 0.117,-0.871 ; 0.046,-0.853 0.117,-0.853 ; 0.046,-0.836 0.099,-0.836 ; 0.046,-0.818 0.099,-0.818 ; 0.046,-0.8 0.099,-0.8 ; 0.046,-0.782 0.099,-0.782 ; 0.046,-0.445 0.401,-0.445 ; 0.046,0.284 0.384,0.284 ; 0.064,-1.351 0.419,-1.351 ; 0.064,-0.267 0.384,-0.267 ; 0.064,0.48 0.366,0.48 ; 0.064,1.778 0.366,1.778 ; 0.081,-0.284 0.348,-0.284 ; 0.081,0.302 0.366,0.302 ; 0.099,-0.462 0.348,-0.462 ; 0.117,0.32 0.312,0.32 ; 0.135,-0.302 0.295,-0.302 ; 0.135,0.498 0.295,0.498 ; 0.135,1.387 0.259,1.387 ; 0.17,-1.76 